# Altium footprint library AltiumLibrary.PcbLib: 122 footprints (part 6 of 8)
Each footprint in its own frame and in the unit in brackets; x right, y up, seen from the top. Pads: shape width x height; smd on the part's side, far side on the other; paste and mask are expansions set on the pad; w line width, h text height; cw(c..) or ccw(c..) is an arc to the next point about the centre after c.
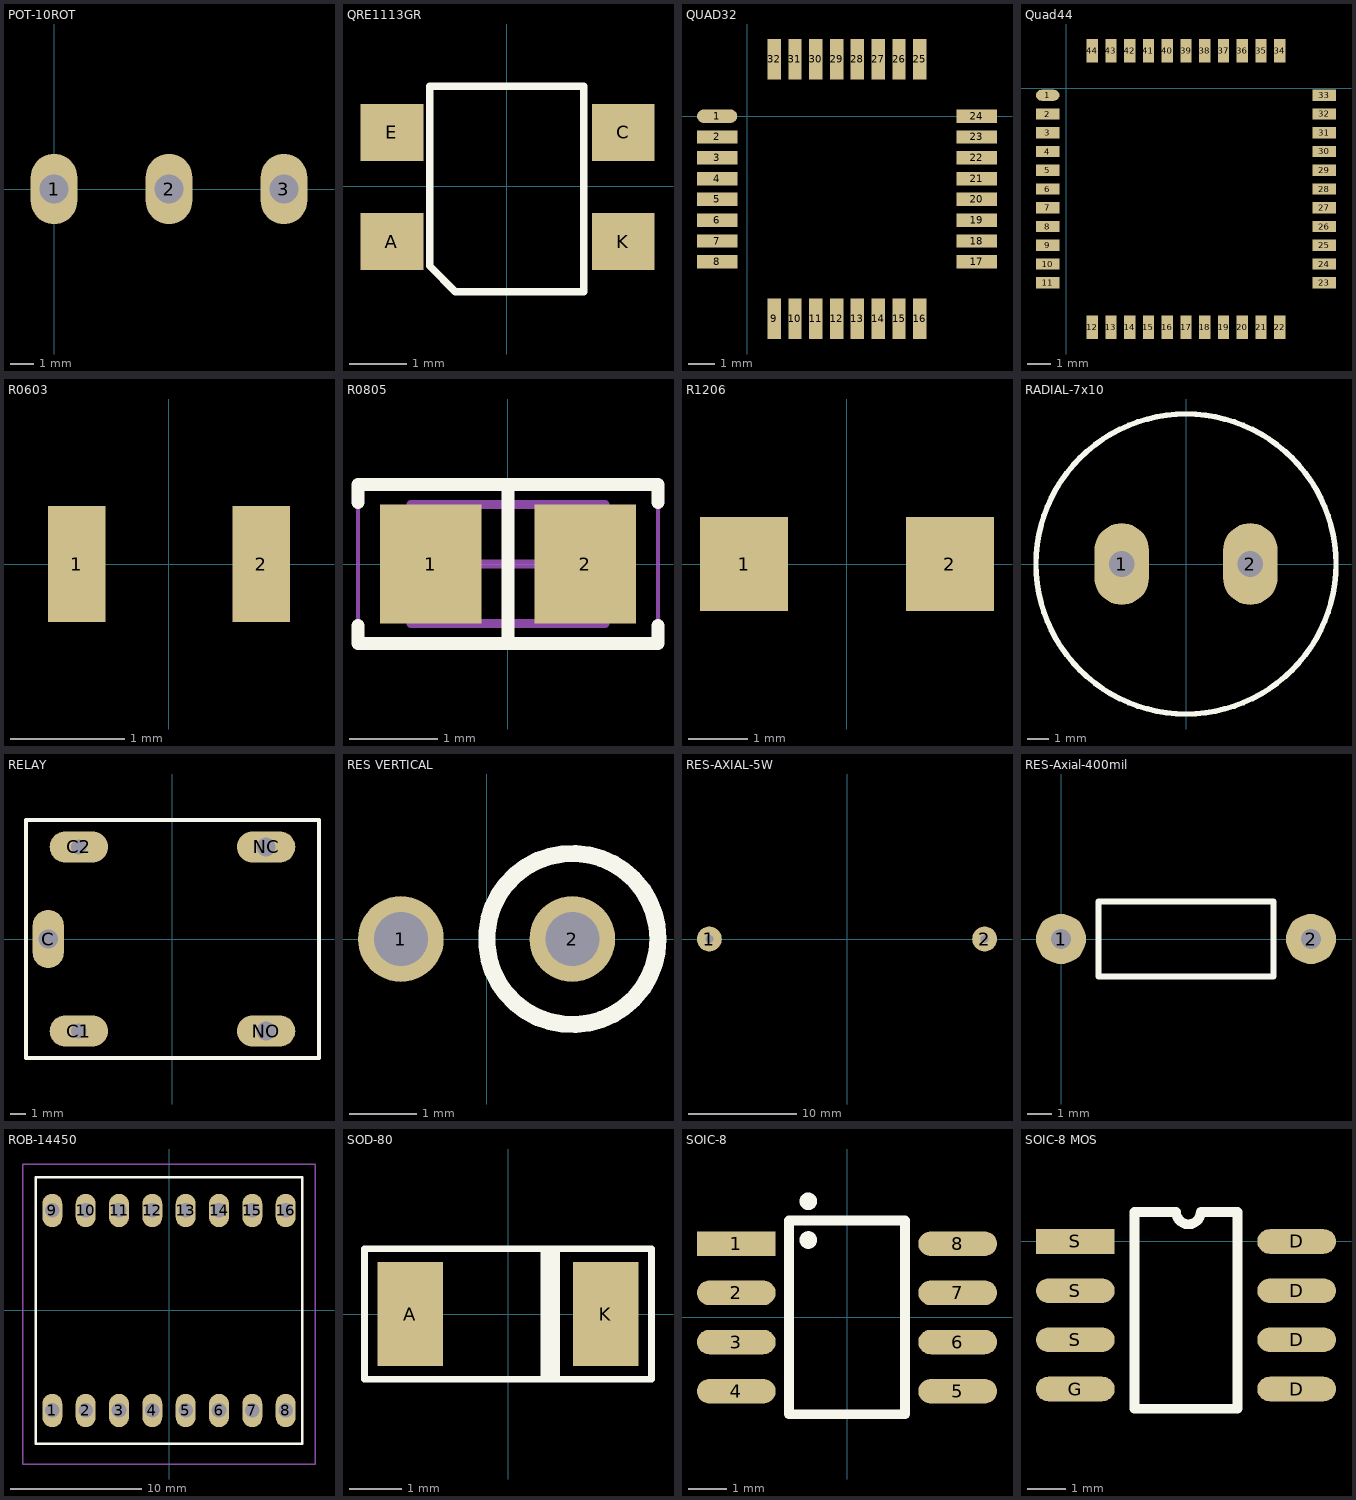
[diagram p5: the footprints below, top view; thin cyan lines are the x and y axes]

## POT-10ROT [mil]
pads (3):
  oval 80x120 hole 49.21: 1(0,0) 2(196.85,0) 3(393.7,0)
3D body "B10K potentiometer 10K.stp": height 828.74, standoff -137.8, extent -137.59,-780.71 535.6,203.54

## QRE1113GR [mm]
pads (4):
  rect 1.1x1 smd: A(-2.01,-0.97) C(2.04,0.94) E(-2.01,0.94) K(2.04,-0.97)
Top Overlay:
  lines w0.127: -1.35,-1.4 -1.35,1.75 1.35,1.75 1.35,-1.85 -0.9,-1.85 -1.35,-1.4
Top Paste:
  region: -2.601,1.5 -1.4,1.5 -1.4,0.4 -2.601,0.4
  region: -2.605,-0.4 -1.4,-0.4 -1.4,-1.503 -2.605,-1.503
  region: 1.453,-0.4 2.65,-0.4 2.65,-1.503 1.453,-1.503
  region: 1.404,1.5 2.65,1.5 2.65,0.401 1.404,0.401
3D body "User Library-QRE1113GR.step": height 1.83, standoff -0.02, extent -2.4,-1.8 2.4,1.8

## QUAD32 [mil]
pads (32):
  oval 60x20 smd: 1(-45,0)
  rect 60x20 smd: 2(-45,-31) 3(-45,-62) 4(-45,-93) 5(-45,-124) 6(-45,-155) 7(-45,-186) 8(-45,-217) 17(342,-217) 18(342,-186) 19(342,-155) 20(342,-124) 21(342,-93) 22(342,-62) 23(342,-31) 24(342,0)
  rect 20x60 smd: 9(40,-302) 10(71,-302) 11(102,-302) 12(133,-302) 13(164,-302) 14(195,-302) 15(226,-302) 16(257,-302) 25(257,85) 26(226,85) 27(195,85) 28(164,85) 29(133,85) 30(102,85) 31(71,85) 32(40,85)
3D body "User Library-PTQFPK32.step": height 68, standoff 5, extent -32,-289 328,71

## Quad44 [mm]
pads (44):
  oval 1x0.47 smd: 1(-0.8,-0.3)
  rect 1x0.47 smd: 2(-0.8,-1.1) 3(-0.8,-1.9) 4(-0.8,-2.7) 5(-0.8,-3.5) 6(-0.8,-4.3) 7(-0.8,-5.1) 8(-0.8,-5.9) 9(-0.8,-6.7) 10(-0.8,-7.5) 11(-0.8,-8.3) 23(11,-8.3) 24(11,-7.5) 25(11,-6.7) 26(11,-5.9) 27(11,-5.1) 28(11,-4.3) 29(11,-3.5) 30(11,-2.7) 31(11,-1.9) 32(11,-1.1) 33(11,-0.3)
  rect 0.47x1 smd: 12(1.1,-10.2) 13(1.9,-10.2) 14(2.7,-10.2) 15(3.5,-10.2) 16(4.3,-10.2) 17(5.1,-10.2) 18(5.9,-10.2) 19(6.7,-10.2) 20(7.5,-10.2) 21(8.3,-10.2) 22(9.1,-10.2) 34(9.1,1.6) 35(8.3,1.6) 36(7.5,1.6) 37(6.7,1.6) 38(5.9,1.6) 39(5.1,1.6) 40(4.3,1.6) 41(3.5,1.6) 42(2.7,1.6) 43(1.9,1.6) 44(1.1,1.6)
3D body "User Library-44 pin tqfp ic package.step": height 1.2, standoff 0.09, extent -0.9,-10.3 11.1,1.7

## R0603 [mil]
pads (2):
  rect 20x40 smd: 1(-31.89,0) 2(31.89,0)
3D body "User Library-0603 SMD Resistor.step": height 11.89, standoff 0, extent -31.49,-15.74 31.5,15.75

## R0805 [mm] "Chip"
height 0.7
pads (2):
  rect 1.15x1.35 smd: 1(-0.875,0) 2(0.875,0)
Top Overlay:
  lines w0.15: -1.7,-0.7 -1.7,-0.9 1.7,-0.9 1.7,-0.7 ; -1.7,0.7 -1.7,0.9 1.7,0.9 1.7,0.7 ; 0,-0.9 0,0.9
Mechanical 13:
  lines w0.1: -1.1,-0.675 -1.1,0.675 1.1,0.675 1.1,-0.675 -1.1,-0.675
Mechanical 15:
  lines w0.05: -1.7,-0.95 -1.7,0.95 1.7,0.95 1.7,-0.95 -1.7,-0.95
  lines w0.1: -0.5,0 0.5,0 ; 0,-0.5 0,0.5
3D body "0805 resistor.STEP": height 0.6, standoff 0, extent -0.95,-0.625 1.05,0.625

## R1206 [mm]
pads (2):
  rect 1.5x1.6 smd: 1(-1.75,0) 2(1.75,0)
3D body "User Library-SMD RESISTOR-1.step": height 0.68, standoff 0.08, extent -1.6,-0.762 1.6,0.838

## RADIAL-7x10 [mm]
pads (2):
  oval 2.54x3.81 hole 1.2 unplated: 1(-3,0) 2(3,0)
Top Overlay:
  circle w0.254: c0,0 r7
3D body "mps_mag_1700_thd_a.STEP": height 1169.8, standoff 1124.75, extent 256.398,-613.814 262.698,-607.514
3D body "mps_mag_1700_thd_a.STEP": height 1169.8, standoff 1124.75, extent 256.398,-613.814 262.698,-607.514
3D body "mps_mag_1700_thd_a.STEP": height 1169.8, standoff 1124.75, extent 260.398,-619.814 266.698,-613.514
3D body "mps_mag_1700_thd_a.STEP": height 1169.8, standoff 1124.75, extent 256.398,-613.814 262.698,-607.514
3D body "mps_mag_1700_thd_a.STEP": height 1169.8, standoff 1124.75, extent 259.398,-616.814 265.698,-610.514
3D body "mps_mag_1700_thd_a.STEP": height 1169.8, standoff 1124.75, extent 256.398,-613.814 262.698,-607.514
3D body "mps_mag_1700_thd_a.STEP": height 1169.8, standoff 1124.75, extent 256.398,-613.814 262.698,-607.514
3D body "mps_mag_1700_thd_a.STEP": height 1169.8, standoff 1124.75, extent 260.398,-621.814 266.698,-615.514
3D body "mps_mag_1700_thd_a.STEP": height 1169.8, standoff 1124.75, extent 258.398,-622.814 264.698,-616.514
3D body "mps_mag_1700_thd_a.STEP": height 1169.8, standoff 1124.75, extent 258.398,-622.814 264.698,-616.514
3D body "mps_mag_1700_thd_a.STEP": height 1169.8, standoff 1124.75, extent 258.398,-622.814 264.698,-616.514
3D body "mps_mag_1700_thd_a.STEP": height 1169.8, standoff 1124.75, extent 258.398,-622.814 264.698,-616.514
3D body "mps_mag_1700_thd_a.STEP": height 1169.8, standoff 1124.75, extent 248.398,-607.814 254.698,-601.514
3D body "mps_mag_1700_thd_a.sldprt": height 1169.8, standoff 1169.75, extent 257.753,-613.02 261.355,-610.272
3D body "mps_mag_1700_thd_a.sldprt": height 1169.8, standoff 1169.75, extent 258.753,-611.02 262.355,-608.272
3D body: height 10, standoff 0, extent -7,-6.998 7,6.998

## RELAY [mm]
pads (5):
  oval 2.032x3.81 hole 1.25 unplated: C(-8.1,0)
  oval 3.81x2.032 hole 1 unplated: C1(-6.1,-6) C2(-6.1,6)
  oval 3.81x2.032 hole 1.25 unplated: NC(6.1,6) NO(6.1,-6)
Top Overlay:
  lines w0.254: -9.55,-7.75 9.55,-7.75 9.55,7.75 -9.55,7.75 -9.55,-7.75
3D body "User Library-relay_songle.STEP": height 15.6, standoff -4.7, extent -9.493,-7.862 9.607,7.638

## RES VERTICAL [mm]
pads (2):
  round 1.27 hole 0.8: 1(-1.27,0) 2(1.27,0)
Top Overlay:
  circle w0.254: c1.27,0 r1.27
3D body "User Library-Res_Stand.step": height 6.79, standoff -1.96, extent -1.52,-0.921 2.192,0.92

## RES-AXIAL-5W [mil]
pads (2):
  round 90 hole 30: 1(-500,0) 2(500,0)
3D body "User Library-Resistor 5W Length 22mm, pitch 1in.step": height 357.17, standoff -211.32, extent -515.74,-187 515.75,187.01

## RES-Axial-400mil [mil]
pads (2):
  round 80 hole 31.5: 1(0,0) 2(400,0)
Top Overlay:
  lines w10: 60,-60 60,0 60,60 340,60 340,-60 60,-60
3D body "SW3dPS-resistor - fixed.STEP": height 94, standoff -110, extent -12,-44 410,44

## ROB-14450 [mil]
pads (16):
  oval 60x100 hole 43.7: 1(-350,-300) 2(-250,-300) 3(-150,-300) 4(-50,-300) 5(50,-300) 6(150,-300) 7(250,-300) 8(350,-300) 9(-350,300) 10(-250,300) 11(-150,300) 12(-50,300) 13(50,300) 14(150,300) 15(250,300) 16(350,300)
Top Overlay:
  lines w7.87: -400,-400 -400,400 400,400 400,-400 -400,-400
Mechanical 20:
  lines w3.94: -439.37,-460.63 -439.37,439.37 439.37,439.37 439.37,-460.63 -439.37,-460.63
3D body "User Library-Motor Driver.STEP": height 239.5, standoff 99, extent -415,-412.5 411,410.51

## SOD-80 [mm]
pads (2):
  rect 1.25x2 smd: A(-1.875,0) K(1.875,0)
Top Overlay:
  rectangle: 0.625,-1.25 1,1.25
  lines w0.127: -2.75,-1.25 -2.75,1.25 2.75,1.25 2.75,-1.25 -2.75,-1.25
3D body "User Library-SOD80-3.STEP": height 1.5, standoff 0, extent -1.8,-0.75 1.8,0.75

## SOIC-8 [mil]
pads (8):
  rect 80x25 smd: 1(-112.5,75)
  oval 80x25 smd: 2(-112.5,25) 3(-112.5,-25) 4(-112.5,-75) 5(112.5,-75) 6(112.5,-25) 7(112.5,25) 8(112.5,75)
Top Overlay:
  circle w10: c-39.37,118.11 r3.94
  circle w10: c-39.37,78.74 r3.94
  lines w10: -59.06,-98.43 59.06,-98.43 59.06,98.43 -59.06,98.43 -59.06,-98.43
3D body "User Library-SOIC-8-1.step": height 68.9, standoff 0, extent -118.1,-96.46 118.11,96.46

## SOIC-8 MOS [mil]
pads (8):
  oval 80x25 smd: D(440,-150) D(440,-100) D(440,-50) D(440,0) G(215,-150) S(215,-100) S(215,-50)
  rect 80x25 smd: S(215,0)
Top Overlay:
  lines w10: 275,-170 380,-170 380,30 342.5,30 cw(c330,30) 317.5,30 275,30 275,-170
3D body "User Library-SOIC-8-1.step": height 68.9, standoff 0, extent 211.9,-171.46 448.12,21.46